# Altium footprint library 3M THD.PcbLib: 163 footprints (part 4 of 14)
Each footprint in its own frame and in the unit in brackets; x right, y up, seen from the top. Pads: shape width x height; smd on the part's side, far side on the other; paste and mask are expansions set on the pad; w line width, h text height; cw(c..) or ccw(c..) is an arc to the next point about the centre after c.
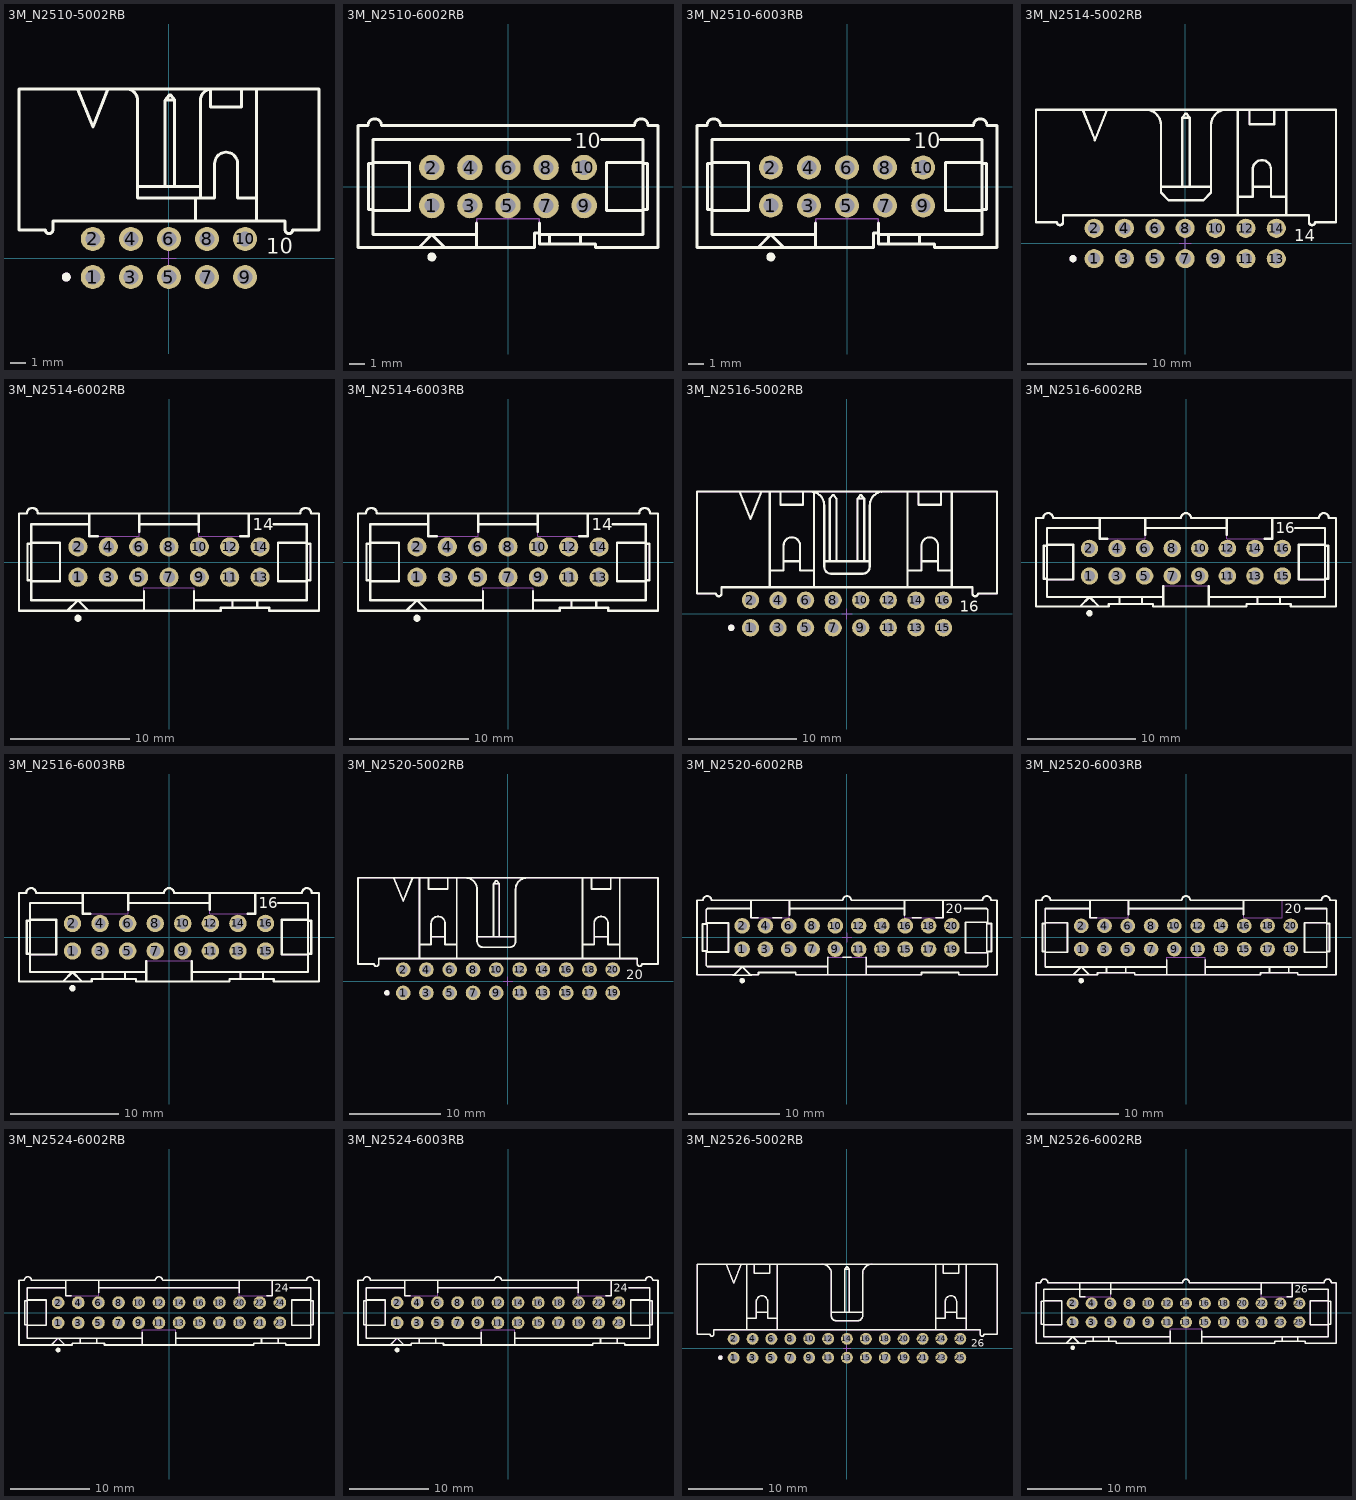
[diagram p3: the footprints below, top view; thin cyan lines are the x and y axes]

## 3M_N2510-5002RB [mm] "10 Contacts - Right Angle .100\" x .100\" Low Profile Four-Wall Header"
height 8.59
pads (10):
  round 1.6 hole 1: 1(-5.08,-1.27) 2(-5.08,1.27) 3(-2.54,-1.27) 4(-2.54,1.27) 5(0,-1.27) 6(0,1.27) 7(2.54,-1.27) 8(2.54,1.27) 9(5.08,-1.27) 10(5.08,1.27)
Top Overlay:
  circle w0.3: c-6.85,-1.27 r0.15
  lines w0.2: -6.093,11.28 -5.077,8.74 -4.061,11.28 ; -2.854,11.28 cw(c-2.854,10.518) -2.092,10.518 -2.092,4.015 2.099,4.015 2.099,10.518 ; -2.092,4.76 2.092,4.76 ; -0.249,4.76 -0.249,10.526 0.012,10.86 0.125,10.86 0.38,10.534 -0.243,10.534 ; 0.38,4.76 0.38,10.526 ; 1.781,2.466 1.781,4.015 3.051,4.015 3.051,6.301 cw(c3.813,6.301) 4.575,6.301 4.575,4.015 5.845,4.015 ; 2.099,10.518 cw(c2.861,10.518) 2.772,11.274 ; 2.772,11.28 2.772,10.06 4.855,10.06 4.855,11.28 ; 5.845,2.466 5.845,11.28 ; -10.004,1.882 -8.252,1.882 ccw(c-7.998,1.882) -7.744,1.882 -7.744,2.466 7.75,2.466 7.75,1.882 ccw(c8.004,1.882) 8.258,1.882 10.011,1.882 10.011,11.28 -10.004,11.28 -10.004,1.882
  text "10" at 6.5,0.3 h1.02
Mechanical 14:
  circle w0.3: c-6.85,-1.27 r0.15
  lines w0.1: -6.093,11.28 -5.077,8.74 -4.061,11.28 ; -2.854,11.28 cw(c-2.854,10.518) -2.092,10.518 -2.092,4.015 2.099,4.015 2.099,10.518 ; -2.092,4.76 2.092,4.76 ; -0.249,4.76 -0.249,10.526 0.012,10.86 0.125,10.86 0.38,10.534 -0.243,10.534 ; 0.38,4.76 0.38,10.526 ; 1.781,2.466 1.781,4.015 3.051,4.015 3.051,6.301 cw(c3.813,6.301) 4.575,6.301 4.575,4.015 5.845,4.015 ; 2.099,10.518 cw(c2.861,10.518) 2.772,11.274 ; 2.772,11.28 2.772,10.06 4.855,10.06 4.855,11.28 ; 5.845,2.466 5.845,11.28 ; -10.004,1.882 -8.252,1.882 ccw(c-7.998,1.882) -7.744,1.882 -7.744,2.466 7.75,2.466 7.75,1.882 ccw(c8.004,1.882) 8.258,1.882 10.011,1.882 10.011,11.28 -10.004,11.28 -10.004,1.882
  text "10" at 6.5,0.3 h1.02
Mechanical 15:
  lines w0.05: -0.5,0 0.5,0 ; 0,-0.5 0,0.5
3D body "3M_N2510-5002RB.stp": height 8.64, standoff -3.98, extent -10.004,-1.587 10.011,11.267

## 3M_N2510-6002RB [mm] "10 Contacts - Straight .100\" x .100\" Low Profile Four-Wall Header"
height 9.91
pads (10):
  round 1.7 hole 1: 1(-5.08,-1.27) 2(-5.08,1.27) 3(-2.54,-1.27) 4(-2.54,1.27) 5(0,-1.27) 6(0,1.27) 7(2.54,-1.27) 8(2.54,1.27) 9(5.08,-1.27) 10(5.08,1.27)
Top Overlay:
  circle w0.3: c-5.08,-4.699 r0.15
  lines w0.2: -8.992,-1.603 -6.579,-1.603 -6.579,1.603 -8.992,1.603 ; -8.992,-1.524 -9.296,-1.524 -9.296,1.524 -8.992,1.524 ; -5.944,-4.064 -5.08,-3.2 -4.216,-4.064 ; -2.096,-4.064 -2.096,-2.438 ; -2.096,-3.2 -8.992,-3.2 -8.992,3.15 4.128,3.15 ; 2.095,-3.2 8.992,-3.2 8.992,3.15 6.223,3.15 ; 2.095,-3.102 1.778,-3.102 1.778,-4.064 -10.008,-4.064 -10.008,4.064 -9.347,4.064 cw(c-8.89,4.064) -8.433,4.064 8.433,4.064 cw(c8.89,4.064) 9.347,4.064 10.008,4.064 10.008,-4.064 5.842,-4.064 5.842,-3.835 2.095,-3.835 2.095,-2.438 ; 2.769,-3.835 2.769,-3.2 ; 4.851,-3.835 4.851,-3.2 ; 8.992,-1.603 6.579,-1.603 6.579,1.603 8.992,1.603 ; 8.992,-1.524 9.296,-1.524 9.296,1.524 8.992,1.524
  text "10" at 4.445,2.54 h1
Mechanical 14:
  lines w0.1: -8.992,-1.603 -6.579,-1.603 -6.579,1.603 -8.992,1.603 ; -8.992,-1.524 -9.296,-1.524 -9.296,1.524 -8.992,1.524 ; -5.944,-4.064 -5.08,-3.2 -4.216,-4.064 ; -2.096,-4.064 -2.096,-2.159 2.095,-2.159 2.095,-3.835 5.842,-3.835 5.842,-4.064 10.008,-4.064 10.008,4.064 9.347,4.064 ccw(c8.89,4.064) 8.433,4.064 -8.433,4.064 ccw(c-8.89,4.064) -9.347,4.064 -10.008,4.064 -10.008,-4.064 1.778,-4.064 1.778,-3.102 2.095,-3.102 ; -2.096,-3.2 -8.992,-3.2 -8.992,3.15 4.128,3.15 ; 2.095,-3.2 8.992,-3.2 8.992,3.15 6.223,3.15 ; 2.769,-3.835 2.769,-3.2 ; 4.851,-3.835 4.851,-3.2 ; 8.992,-1.603 6.579,-1.603 6.579,1.603 8.992,1.603 ; 8.992,-1.524 9.296,-1.524 9.296,1.524 8.992,1.524
  text "10" at 4.445,2.54 h1
3D body "3M_N2510-6002RB.stp": height 9.91, standoff -2.84, extent -10.007,-4.115 10.008,4.521

## 3M_N2510-6003RB [mm] "10 Contacts - Straight .100\" x .100\" Low Profile Four-Wall Header (Solder Tail 3.94mm)"
height 9.91
pads (10):
  round 1.6 hole 1: 1(-5.08,-1.27) 2(-5.08,1.27) 3(-2.54,-1.27) 4(-2.54,1.27) 5(0,-1.27) 6(0,1.27) 7(2.54,-1.27) 8(2.54,1.27) 9(5.08,-1.27) 10(5.08,1.27)
Top Overlay:
  circle w0.3: c-5.08,-4.699 r0.15
  lines w0.2: -8.992,-1.603 -6.579,-1.603 -6.579,1.603 -8.992,1.603 ; -8.992,-1.524 -9.296,-1.524 -9.296,1.524 -8.992,1.524 ; -5.944,-4.064 -5.08,-3.2 -4.216,-4.064 ; -2.096,-4.064 -2.096,-2.438 ; -2.096,-3.2 -8.992,-3.2 -8.992,3.15 4.128,3.15 ; 2.095,-3.2 8.992,-3.2 8.992,3.15 6.223,3.15 ; 2.095,-3.102 1.778,-3.102 1.778,-4.064 -10.008,-4.064 -10.008,4.064 -9.347,4.064 cw(c-8.89,4.064) -8.433,4.064 8.433,4.064 cw(c8.89,4.064) 9.347,4.064 10.008,4.064 10.008,-4.064 5.842,-4.064 5.842,-3.835 2.095,-3.835 2.095,-2.438 ; 2.769,-3.835 2.769,-3.2 ; 4.851,-3.835 4.851,-3.2 ; 8.992,-1.603 6.579,-1.603 6.579,1.603 8.992,1.603 ; 8.992,-1.524 9.296,-1.524 9.296,1.524 8.992,1.524
  text "10" at 4.445,2.54 h1.02
Mechanical 14:
  lines w0.1: -8.992,-1.603 -6.579,-1.603 -6.579,1.603 -8.992,1.603 ; -8.992,-1.524 -9.296,-1.524 -9.296,1.524 -8.992,1.524 ; -5.944,-4.064 -5.08,-3.2 -4.216,-4.064 ; -2.096,-4.064 -2.096,-2.159 2.095,-2.159 2.095,-3.835 5.842,-3.835 5.842,-4.064 10.008,-4.064 10.008,4.064 9.347,4.064 ccw(c8.89,4.064) 8.433,4.064 -8.433,4.064 ccw(c-8.89,4.064) -9.347,4.064 -10.008,4.064 -10.008,-4.064 1.778,-4.064 1.778,-3.102 2.095,-3.102 ; -2.096,-3.2 -8.992,-3.2 -8.992,3.15 4.128,3.15 ; 2.095,-3.2 8.992,-3.2 8.992,3.15 6.223,3.15 ; 2.769,-3.835 2.769,-3.2 ; 4.851,-3.835 4.851,-3.2 ; 8.992,-1.603 6.579,-1.603 6.579,1.603 8.992,1.603 ; 8.992,-1.524 9.296,-1.524 9.296,1.524 8.992,1.524
  text "10" at 4.445,2.54 h1.02
3D body "3M_N2510-6003RB.stp": height 9.91, standoff -3.94, extent -10.007,-4.115 10.008,4.521

## 3M_N2514-5002RB [mm] "14 Contacts - Right Angle .100\" x .100\" Low Profile Four-Wall Header"
height 8.59
pads (14):
  round 1.6 hole 1: 1(-7.62,-1.27) 2(-7.62,1.27) 3(-5.08,-1.27) 4(-5.08,1.27) 5(-2.54,-1.27) 6(-2.54,1.27) 7(0,-1.27) 8(0,1.27) 9(2.54,-1.27) 10(2.54,1.27) 11(5.08,-1.27) 12(5.08,1.27) 13(7.62,-1.27) 14(7.62,1.27)
Top Overlay:
  circle w0.3: c-9.39,-1.27 r0.15
  lines w0.2: -8.568,11.186 -7.552,8.646 -6.536,11.186 ; -3.297,11.186 cw(c-3.297,9.916) -2.027,9.916 -2.027,4.252 -1.392,3.617 1.529,3.617 2.164,4.252 2.164,9.916 cw(c3.434,9.916) 3.434,11.186 ; -2.027,4.76 2.164,4.76 ; -0.249,4.76 -0.249,10.526 0.012,10.86 0.125,10.86 0.38,10.534 -0.243,10.534 ; 0.38,4.76 0.38,10.526 ; 4.399,2.372 4.399,11.186 ; 4.399,3.922 5.656,3.922 5.656,6.208 cw(c6.418,6.208) 7.18,6.208 7.18,3.922 8.45,3.922 ; 5.377,11.186 5.377,9.967 7.46,9.967 7.46,11.186 ; 5.656,4.76 7.18,4.76 ; 8.45,2.372 8.45,11.186 ; -12.479,1.788 -12.479,11.186 12.616,11.186 12.616,1.788 10.863,1.788 cw(c10.609,1.788) 10.355,1.788 10.355,2.372 -10.219,2.372 -10.219,1.788 cw(c-10.473,1.788) -10.727,1.788 -12.479,1.788
  text "14" at 9.105,0.207 h1.02
Mechanical 14:
  circle w0.3: c-9.39,-1.27 r0.15
  lines w0.1: -8.568,11.186 -7.552,8.646 -6.536,11.186 ; -3.297,11.186 cw(c-3.297,9.916) -2.027,9.916 -2.027,4.252 -1.392,3.617 1.529,3.617 2.164,4.252 2.164,9.916 cw(c3.434,9.916) 3.434,11.186 ; -2.027,4.76 2.164,4.76 ; -0.249,4.76 -0.249,10.526 0.012,10.86 0.125,10.86 0.38,10.534 -0.243,10.534 ; 0.38,4.76 0.38,10.526 ; 4.399,2.372 4.399,11.186 ; 4.399,3.922 5.656,3.922 5.656,6.208 cw(c6.418,6.208) 7.18,6.208 7.18,3.922 8.45,3.922 ; 5.377,11.186 5.377,9.967 7.46,9.967 7.46,11.186 ; 5.656,4.76 7.18,4.76 ; 8.45,2.372 8.45,11.186 ; -12.479,1.788 -12.479,11.186 12.616,11.186 12.616,1.788 10.863,1.788 cw(c10.609,1.788) 10.355,1.788 10.355,2.372 -10.219,2.372 -10.219,1.788 cw(c-10.473,1.788) -10.727,1.788 -12.479,1.788
  text "14" at 9.105,0.207 h1.02
Mechanical 15:
  lines w0.05: -0.5,0 0.5,0 ; 0,-0.5 0,0.5
3D body "3M_N2514-5002RB.stp": height 8.64, standoff -3.98, extent -12.479,-1.681 12.616,11.174

## 3M_N2514-6002RB [mm] "14 Contacts - Straight .100\" x .100\" Low Profile Four-Wall Header"
height 9.91
pads (14):
  round 1.6 hole 1: 1(-7.62,-1.27) 2(-7.62,1.27) 3(-5.08,-1.27) 4(-5.08,1.27) 5(-2.54,-1.27) 6(-2.54,1.27) 7(0,-1.27) 8(0,1.27) 9(2.54,-1.27) 10(2.54,1.27) 11(5.08,-1.27) 12(5.08,1.27) 13(7.62,-1.27) 14(7.62,1.27)
Top Overlay:
  circle w0.3: c-7.62,-4.699 r0.15
  lines w0.2: -11.532,-1.603 -9.119,-1.603 -9.119,1.603 -11.532,1.603 ; -11.532,-1.524 -11.836,-1.524 -11.836,1.524 -11.532,1.524 ; -8.484,-4.064 -7.62,-3.2 -6.756,-4.064 ; -6.668,3.15 -11.532,3.15 -11.532,-3.2 -2.096,-3.2 ; -6.668,4.064 -6.668,2.159 -5.959,2.159 ; -2.477,2.518 -2.477,4.064 ; -2.477,3.15 2.476,3.15 ; -2.096,-4.064 -2.096,-2.438 ; 2.095,-4.064 2.095,-2.438 ; 2.095,-3.2 11.532,-3.2 11.532,3.15 8.763,3.15 ; 2.476,2.518 2.476,4.064 ; 5.309,-3.835 5.309,-3.2 ; 5.959,2.159 6.668,2.159 6.668,4.064 ; 7.391,-3.835 7.391,-3.2 ; 11.532,-1.603 9.119,-1.603 9.119,1.603 11.532,1.603 ; 11.532,-1.524 11.836,-1.524 11.836,1.524 11.532,1.524 ; -12.548,-4.064 4.318,-4.064 4.318,-3.835 8.382,-3.835 8.382,-4.064 12.548,-4.064 12.548,4.064 11.887,4.064 ccw(c11.43,4.064) 10.973,4.064 -10.973,4.064 ccw(c-11.43,4.064) -11.887,4.064 -12.548,4.064 -12.548,-4.064
  text "14" at 6.985,2.667 h1.02
Mechanical 14:
  lines w0.1: -11.532,-1.603 -9.119,-1.603 -9.119,1.603 -11.532,1.603 ; -11.532,-1.524 -11.836,-1.524 -11.836,1.524 -11.532,1.524 ; -8.484,-4.064 -7.62,-3.2 -6.756,-4.064 ; -6.668,3.15 -11.532,3.15 -11.532,-3.2 -2.096,-3.2 ; -6.668,4.064 -6.668,2.159 -2.477,2.159 -2.477,4.064 ; -2.477,3.15 2.476,3.15 ; -2.096,-4.064 -2.096,-2.159 2.095,-2.159 2.095,-4.064 ; 2.095,-3.2 11.532,-3.2 11.532,3.15 8.763,3.15 ; 2.476,4.064 2.476,2.159 6.668,2.159 6.668,4.064 ; 5.309,-3.835 5.309,-3.2 ; 7.391,-3.835 7.391,-3.2 ; 11.532,-1.603 9.119,-1.603 9.119,1.603 11.532,1.603 ; 11.532,-1.524 11.836,-1.524 11.836,1.524 11.532,1.524 ; -12.548,-4.064 4.318,-4.064 4.318,-3.835 8.382,-3.835 8.382,-4.064 12.548,-4.064 12.548,4.064 11.887,4.064 ccw(c11.43,4.064) 10.973,4.064 -10.973,4.064 ccw(c-11.43,4.064) -11.887,4.064 -12.548,4.064 -12.548,-4.064
  text "14" at 6.985,2.667 h1.02
3D body "3M_N2514-6002RB.stp": height 9.91, standoff -2.84, extent -12.547,-4.115 12.548,4.521

## 3M_N2514-6003RB [mm] "14 Contacts - Straight .100\" x .100\" Low Profile Four-Wall Header (Solder Tail 3.94mm)"
height 9.91
pads (14):
  round 1.6 hole 1: 1(-7.62,-1.27) 2(-7.62,1.27) 3(-5.08,-1.27) 4(-5.08,1.27) 5(-2.54,-1.27) 6(-2.54,1.27) 7(0,-1.27) 8(0,1.27) 9(2.54,-1.27) 10(2.54,1.27) 11(5.08,-1.27) 12(5.08,1.27) 13(7.62,-1.27) 14(7.62,1.27)
Top Overlay:
  circle w0.3: c-7.62,-4.699 r0.15
  lines w0.2: -11.532,-1.603 -9.119,-1.603 -9.119,1.603 -11.532,1.603 ; -11.532,-1.524 -11.836,-1.524 -11.836,1.524 -11.532,1.524 ; -8.484,-4.064 -7.62,-3.2 -6.756,-4.064 ; -6.668,3.15 -11.532,3.15 -11.532,-3.2 -2.096,-3.2 ; -6.668,4.064 -6.668,2.159 -5.959,2.159 ; -2.477,2.518 -2.477,4.064 ; -2.477,3.15 2.476,3.15 ; -2.096,-4.064 -2.096,-2.438 ; 2.095,-4.064 2.095,-2.438 ; 2.095,-3.2 11.532,-3.2 11.532,3.15 8.763,3.15 ; 2.476,2.518 2.476,4.064 ; 5.309,-3.835 5.309,-3.2 ; 5.959,2.159 6.668,2.159 6.668,4.064 ; 7.391,-3.835 7.391,-3.2 ; 11.532,-1.603 9.119,-1.603 9.119,1.603 11.532,1.603 ; 11.532,-1.524 11.836,-1.524 11.836,1.524 11.532,1.524 ; -12.548,-4.064 4.318,-4.064 4.318,-3.835 8.382,-3.835 8.382,-4.064 12.548,-4.064 12.548,4.064 11.887,4.064 ccw(c11.43,4.064) 10.973,4.064 -10.973,4.064 ccw(c-11.43,4.064) -11.887,4.064 -12.548,4.064 -12.548,-4.064
  text "14" at 6.985,2.667 h1.02
Mechanical 14:
  lines w0.1: -11.532,-1.603 -9.119,-1.603 -9.119,1.603 -11.532,1.603 ; -11.532,-1.524 -11.836,-1.524 -11.836,1.524 -11.532,1.524 ; -8.484,-4.064 -7.62,-3.2 -6.756,-4.064 ; -6.668,3.15 -11.532,3.15 -11.532,-3.2 -2.096,-3.2 ; -6.668,4.064 -6.668,2.159 -2.477,2.159 -2.477,4.064 ; -2.477,3.15 2.476,3.15 ; -2.096,-4.064 -2.096,-2.159 2.095,-2.159 2.095,-4.064 ; 2.095,-3.2 11.532,-3.2 11.532,3.15 8.763,3.15 ; 2.476,4.064 2.476,2.159 6.668,2.159 6.668,4.064 ; 5.309,-3.835 5.309,-3.2 ; 7.391,-3.835 7.391,-3.2 ; 11.532,-1.603 9.119,-1.603 9.119,1.603 11.532,1.603 ; 11.532,-1.524 11.836,-1.524 11.836,1.524 11.532,1.524 ; -12.548,-4.064 4.318,-4.064 4.318,-3.835 8.382,-3.835 8.382,-4.064 12.548,-4.064 12.548,4.064 11.887,4.064 ccw(c11.43,4.064) 10.973,4.064 -10.973,4.064 ccw(c-11.43,4.064) -11.887,4.064 -12.548,4.064 -12.548,-4.064
  text "14" at 6.985,2.667 h1.02
3D body "3M_N2514-6003RB.stp": height 9.91, standoff -3.94, extent -12.547,-4.115 12.548,4.521

## 3M_N2516-5002RB [mm] "16 Contacts - Right Angle .100\" x .100\" Low Profile Four-Wall Header"
height 8.59
pads (16):
  round 1.6 hole 1: 1(-8.89,-1.27) 2(-8.89,1.27) 3(-6.35,-1.27) 4(-6.35,1.27) 5(-3.81,-1.27) 6(-3.81,1.27) 7(-1.27,-1.27) 8(-1.27,1.27) 9(1.27,-1.27) 10(1.27,1.27) 11(3.81,-1.27) 12(3.81,1.27) 13(6.35,-1.27) 14(6.35,1.27) 15(8.89,-1.27) 16(8.89,1.27)
Top Overlay:
  circle w0.3: c-10.66,-1.27 r0.15
  lines w0.2: -9.903,11.28 -8.887,8.74 -7.871,11.28 ; -7.109,2.466 -7.109,11.28 ; -7.109,4.015 -5.839,4.015 -5.839,6.301 cw(c-5.077,6.301) -4.315,6.301 -4.315,4.015 -3.045,4.015 ; -6.118,11.28 -6.118,10.06 -4.035,10.06 -4.035,11.28 ; -5.839,4.854 -4.315,4.853 ; -3.362,11.28 cw(c-3.362,10.01) -2.092,10.01 -2.092,4.345 ccw(c-1.457,4.345) -1.457,3.71 ; -3.045,2.466 -3.045,11.239 ; -2.092,4.853 2.099,4.853 ; -1.584,4.853 -1.584,10.619 -1.323,10.954 -1.21,10.954 -0.956,10.628 -0.956,4.853 ; -1.457,3.71 1.464,3.71 ; 0.956,4.853 0.962,10.628 ; 1.464,3.71 ccw(c1.464,4.345) 2.099,4.345 2.099,10.01 ; 1.584,4.853 1.584,10.619 ; 2.099,10.01 cw(c3.369,10.01) 3.369,11.28 ; 5.591,2.466 5.591,11.28 ; 5.591,4.015 6.861,4.015 6.861,6.301 cw(c7.623,6.301) 8.385,6.301 8.385,4.015 9.655,4.015 ; 6.582,11.28 6.582,10.06 8.665,10.06 8.665,11.28 ; 6.861,4.853 8.385,4.853 ; 9.655,2.466 9.655,11.28 ; 0.962,10.628 1.217,10.954 1.33,10.954 1.584,10.619 ; 0.962,10.628 1.584,10.619 ; -13.814,1.882 -13.814,11.28 13.821,11.28 13.821,1.882 12.068,1.882 cw(c11.814,1.882) 11.56,1.882 11.56,2.466 -11.554,2.466 -11.554,1.882 cw(c-11.808,1.882) -12.062,1.882 -13.814,1.882
  text "16" at 10.375,0.207 h1.02
Mechanical 14:
  circle w0.3: c-10.66,-1.27 r0.15
  lines w0.1: -9.903,11.28 -8.887,8.74 -7.871,11.28 ; -7.109,2.466 -7.109,11.28 ; -7.109,4.015 -5.839,4.015 -5.839,6.301 cw(c-5.077,6.301) -4.315,6.301 -4.315,4.015 -3.045,4.015 ; -6.118,11.28 -6.118,10.06 -4.035,10.06 -4.035,11.28 ; -5.839,4.854 -4.315,4.853 ; -3.362,11.28 cw(c-3.362,10.01) -2.092,10.01 -2.092,4.345 ccw(c-1.457,4.345) -1.457,3.71 ; -3.045,2.466 -3.045,11.239 ; -2.092,4.853 2.099,4.853 ; -1.584,4.853 -1.584,10.619 -1.323,10.954 -1.21,10.954 -0.956,10.628 -0.956,4.853 ; -1.457,3.71 1.464,3.71 ; 0.956,4.853 0.962,10.628 ; 1.464,3.71 ccw(c1.464,4.345) 2.099,4.345 2.099,10.01 ; 1.584,4.853 1.584,10.619 ; 2.099,10.01 cw(c3.369,10.01) 3.369,11.28 ; 5.591,2.466 5.591,11.28 ; 5.591,4.015 6.861,4.015 6.861,6.301 cw(c7.623,6.301) 8.385,6.301 8.385,4.015 9.655,4.015 ; 6.582,11.28 6.582,10.06 8.665,10.06 8.665,11.28 ; 6.861,4.853 8.385,4.853 ; 9.655,2.466 9.655,11.28 ; 0.962,10.628 1.217,10.954 1.33,10.954 1.584,10.619 ; 0.962,10.628 1.584,10.619 ; -13.814,1.882 -13.814,11.28 13.821,11.28 13.821,1.882 12.068,1.882 cw(c11.814,1.882) 11.56,1.882 11.56,2.466 -11.554,2.466 -11.554,1.882 cw(c-11.808,1.882) -12.062,1.882 -13.814,1.882
  text "16" at 10.375,0.207 h1.02
Mechanical 15:
  lines w0.05: -0.5,0 0.5,0 ; 0,-0.5 0,0.5
3D body "3M_N2516-5002RB.stp": height 8.64, standoff -3.98, extent -13.814,-1.587 13.821,11.267

## 3M_N2516-6002RB [mm] "16 Contacts - Straight .100\" x .100\" Low Profile Four-Wall Header"
height 9.91
pads (16):
  round 1.6 hole 1: 1(-8.89,-1.27) 2(-8.89,1.27) 3(-6.35,-1.27) 4(-6.35,1.27) 5(-3.81,-1.27) 6(-3.81,1.27) 7(-1.27,-1.27) 8(-1.27,1.27) 9(1.27,-1.27) 10(1.27,1.27) 11(3.81,-1.27) 12(3.81,1.27) 13(6.35,-1.27) 14(6.35,1.27) 15(8.89,-1.27) 16(8.89,1.27)
Top Overlay:
  circle w0.3: c-8.89,-4.699 r0.15
  lines w0.2: -12.802,-1.603 -10.389,-1.603 -10.389,1.603 -12.802,1.603 ; -12.802,-1.524 -13.106,-1.524 -13.106,1.524 -12.802,1.524 ; -9.754,-4.064 -8.89,-3.2 -8.026,-4.064 ; -7.938,3.15 -12.802,3.15 -12.802,-3.2 -2.096,-3.2 ; -7.938,4.064 -7.938,2.159 -7.229,2.159 ; -6.121,-3.835 -6.121,-3.2 ; -4.039,-3.835 -4.039,-3.2 ; -3.747,2.518 -3.747,4.064 ; -3.747,3.15 3.747,3.15 ; -2.096,-4.064 -2.096,-2.209 ; 2.095,-4.064 2.095,-2.209 ; 2.095,-3.2 12.802,-3.2 12.802,3.15 10.033,3.15 ; 3.747,2.518 3.747,4.064 ; 6.579,-3.835 6.579,-3.2 ; 7.229,2.159 7.938,2.159 7.938,4.064 ; 8.661,-3.835 8.661,-3.2 ; 12.802,-1.603 10.389,-1.603 10.389,1.603 12.802,1.603 ; 12.802,-1.524 13.106,-1.524 13.106,1.524 12.802,1.524 ; -13.818,-4.064 -7.112,-4.064 -7.112,-3.835 -3.048,-3.835 -3.048,-4.064 5.588,-4.064 5.588,-3.835 9.652,-3.835 9.652,-4.064 13.818,-4.064 13.818,4.064 13.157,4.064 ccw(c12.7,4.064) 12.243,4.064 0.457,4.064 ccw(c0,4.064) -0.457,4.064 -12.243,4.064 ccw(c-12.7,4.064) -13.157,4.064 -13.818,4.064 -13.818,-4.064
  text "16" at 8.255,2.667 h1.02
Mechanical 14:
  lines w0.1: -12.802,-1.603 -10.389,-1.603 -10.389,1.603 -12.802,1.603 ; -12.802,-1.524 -13.106,-1.524 -13.106,1.524 -12.802,1.524 ; -9.754,-4.064 -8.89,-3.2 -8.026,-4.064 ; -7.938,3.15 -12.802,3.15 -12.802,-3.2 -2.096,-3.2 ; -7.938,4.064 -7.938,2.159 -3.747,2.159 -3.747,4.064 ; -6.121,-3.835 -6.121,-3.2 ; -4.039,-3.835 -4.039,-3.2 ; -3.747,3.15 3.747,3.15 ; -2.096,-4.064 -2.096,-2.159 2.095,-2.159 2.095,-4.064 ; 2.095,-3.2 12.802,-3.2 12.802,3.15 10.033,3.15 ; 3.747,4.064 3.747,2.159 7.938,2.159 7.938,4.064 ; 6.579,-3.835 6.579,-3.2 ; 8.661,-3.835 8.661,-3.2 ; 12.802,-1.603 10.389,-1.603 10.389,1.603 12.802,1.603 ; 12.802,-1.524 13.106,-1.524 13.106,1.524 12.802,1.524 ; -13.818,-4.064 -7.112,-4.064 -7.112,-3.835 -3.048,-3.835 -3.048,-4.064 5.588,-4.064 5.588,-3.835 9.652,-3.835 9.652,-4.064 13.818,-4.064 13.818,4.064 13.157,4.064 ccw(c12.7,4.064) 12.243,4.064 0.457,4.064 ccw(c0,4.064) -0.457,4.064 -12.243,4.064 ccw(c-12.7,4.064) -13.157,4.064 -13.818,4.064 -13.818,-4.064
  text "16" at 8.255,2.667 h1.02
3D body "3M_N2516-6002RB.stp": height 9.65, standoff -2.84, extent -13.817,-4.166 13.818,4.521
